# Altium footprint library DipComponent.PcbLib: 303 footprints (part 1 of 19)
Each footprint in its own frame and in the unit in brackets; x right, y up, seen from the top. Pads: shape width x height; smd on the part's side, far side on the other; paste and mask are expansions set on the pad; w line width, h text height; cw(c..) or ccw(c..) is an arc to the next point about the centre after c.
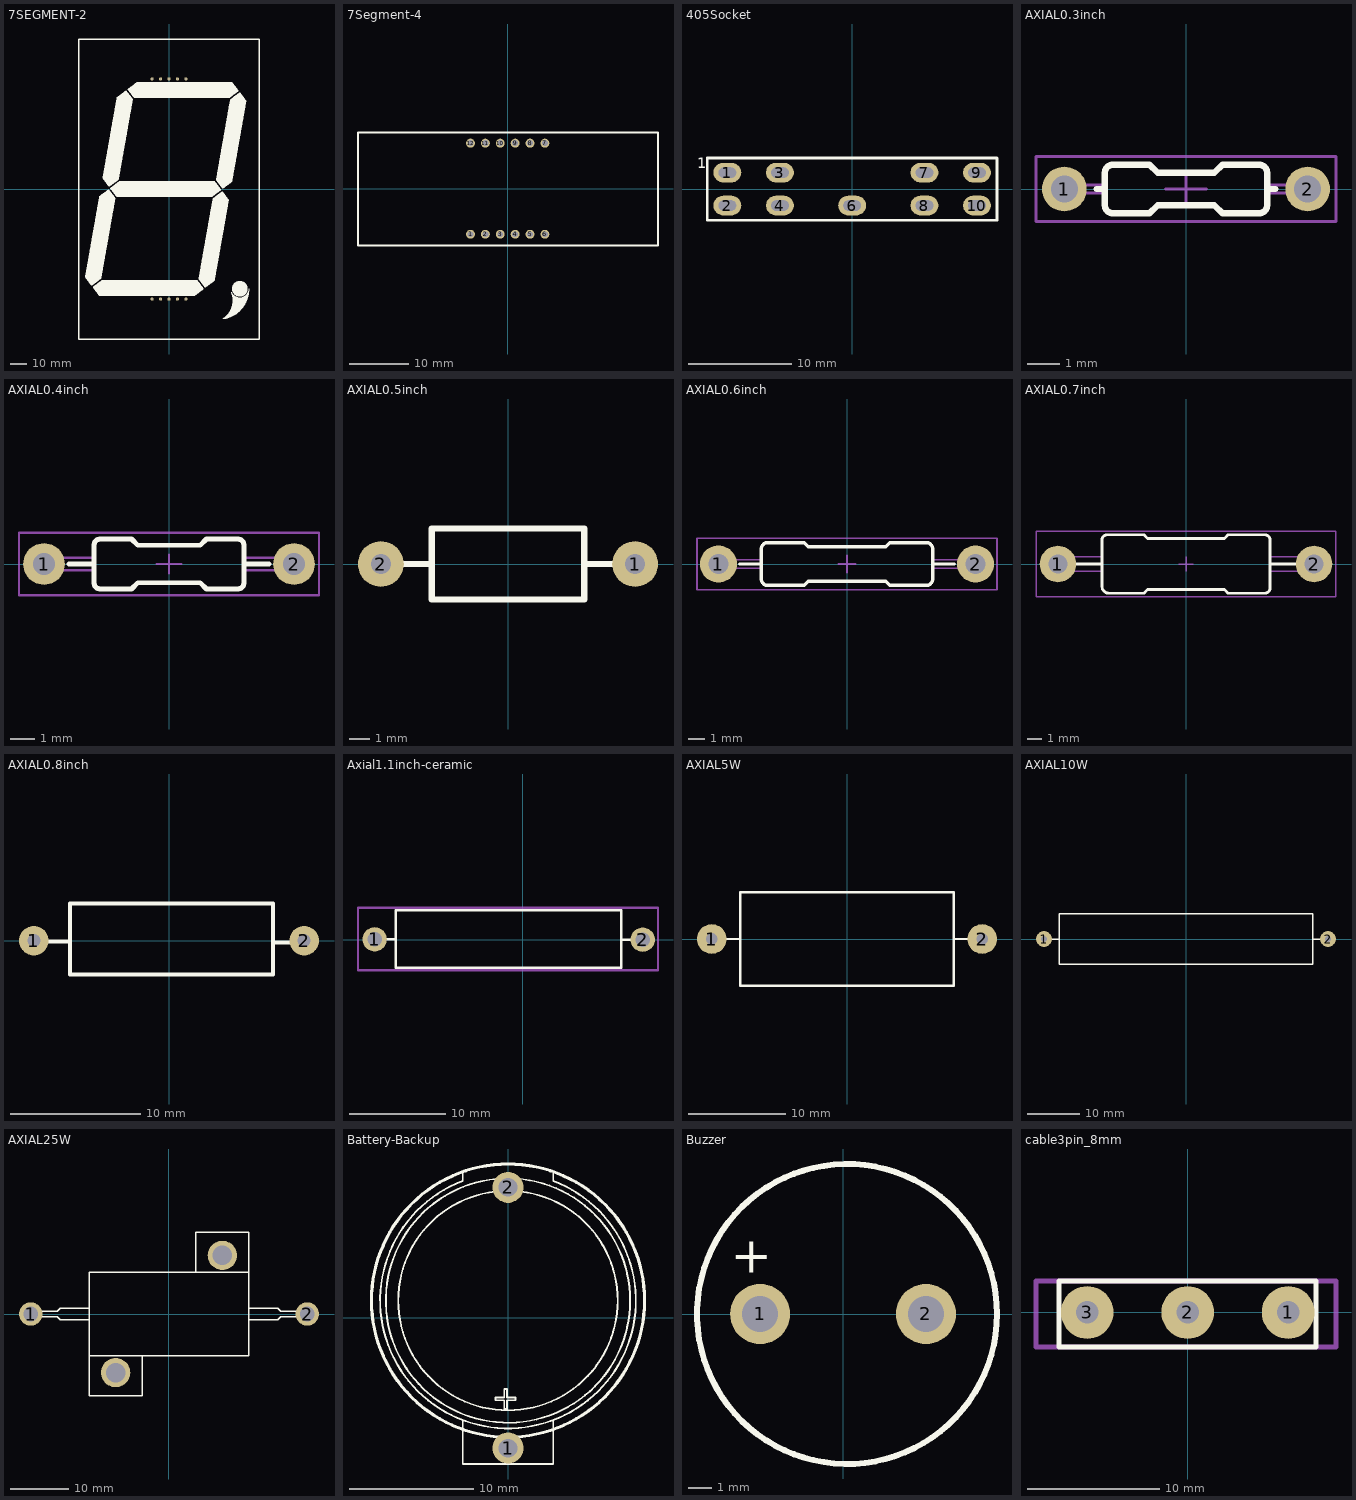
[diagram p0: the footprints below, top view; thin cyan lines are the x and y axes]

## 7SEGMENT-2 [mm]
pads (10):
  round 2 hole 0.85: 1(-10.16,-66.002) 2(-5.08,-66.002) 3(0,-66.002) 4(5.08,-66.002) 5(10.16,-66.002) 6(10.16,66.002) 7(5.08,66.002) 8(0,66.002) 9(-5.08,66.002) 10(-10.16,66.002)
Top Overlay:
  drawing of 13 lines, arcs and shapes, not listed
3D body "7Segment.STEP": height 15.6, standoff -4.3, extent -54.01,-90.002 53.99,89.998

## 7Segment-4 [mm]
pads (12):
  round 1.5 hole 1: 1(-6.25,-7.65) 2(-3.75,-7.65) 3(-1.25,-7.65) 4(1.25,-7.65) 5(3.75,-7.65) 6(6.25,-7.65) 7(6.25,7.65) 8(3.75,7.65) 9(1.25,7.65) 10(-1.25,7.65) 11(-3.75,7.65) 12(-6.25,7.65)
Top Overlay:
  lines w0.349: -25.15,-9.55 -25.15,9.45 25.25,9.45 25.25,-9.55 -25.15,-9.55
3D body "User Library-C-564 (7 segment 4 digit LED display).STEP": height 8, standoff -6.2, extent -25.15,-9.55 25.25,9.45

## 405Socket [mm]
pads (9):
  oval 2.7x1.9 hole 1 slot 1.7 at 0 deg: 1(-12.065,1.587) 2(-12.065,-1.587) 3(-6.985,1.587) 4(-6.985,-1.587) 6(0,-1.587) 7(6.985,1.587) 8(6.985,-1.587) 9(12.065,1.587) 10(12.065,-1.587)
Top Overlay:
  lines w0.254: -14,-3 -14,3 14,3 14,-3 -14,-3
  text "1" at -15,2 h1.02

## AXIAL0.3inch [mm] "Resistor, Axial; Body 5.08 x 1.6 mm ,Pitch 7.62mm"
height 1.524
pads (2):
  round 1.4 hole 0.85: 1(-3.81,0) 2(3.81,0)
Top Overlay:
  lines w0.2: -2.794,0 -2.54,0 ; 2.543,0 2.794,0 ; -2.54,-0.508 ccw(c-2.286,-0.508) -2.286,-0.762 -1.143,-0.762 -0.889,-0.508 0.889,-0.508 1.143,-0.762 2.286,-0.762 ccw(c2.286,-0.508) 2.54,-0.508 2.54,0.508 ccw(c2.286,0.508) 2.286,0.762 1.143,0.762 0.889,0.508 -0.889,0.508 -1.143,0.762 -2.286,0.762 ccw(c-2.286,0.508) -2.54,0.508 -2.54,-0.508
Mechanical 13:
  lines w0.1: -3.683,-0.127 -3.683,0.127 ; -2.54,-0.127 -3.937,-0.127 cw(c-3.937,0) -4.064,0 cw(c-3.937,0) -3.937,0.127 -2.54,0.127 ; 2.54,-0.127 3.937,-0.127 ccw(c3.937,0) 4.064,0 ccw(c3.937,0) 3.937,0.127 2.54,0.127 ; 3.683,-0.127 3.683,0.127 ; -2.54,-0.508 ccw(c-2.286,-0.508) -2.286,-0.762 -1.143,-0.762 -0.889,-0.508 0.889,-0.508 1.143,-0.762 2.286,-0.762 ccw(c2.286,-0.508) 2.54,-0.508 2.54,0.508 ccw(c2.286,0.508) 2.286,0.762 1.143,0.762 0.889,0.508 -0.889,0.508 -1.143,0.762 -2.286,0.762 ccw(c-2.286,0.508) -2.54,0.508 -2.54,-0.508
Mechanical 15:
  lines w0.1: -0.635,0 0,0 ; 0,-0.508 0,0 ; 0,0.508 0,0 ; 0.635,0 0,0 ; -4.699,-1.016 4.699,-1.016 4.699,1.016 -4.699,1.016 -4.699,-1.016
3D body: height 1.52, standoff 0, extent -2.541,-0.763 2.541,0.763
3D body: height 0.9, standoff 0.7, extent -3.683,-0.127 -2.54,0.127
3D body: height 0.9, standoff 0, extent -4.064,-0.127 -3.683,0.127
3D body: height 0.9, standoff 0, extent 3.683,-0.127 4.064,0.127
3D body: height 0.9, standoff 0.7, extent 2.54,-0.127 3.683,0.127

## AXIAL0.4inch [mm] "Resistor, Axial; Body 6.1 x 2mm ,Pitch 10.16mm"
height 2.032
pads (2):
  round 1.7 hole 0.9: 1(-5.08,0) 2(5.08,0)
Top Overlay:
  lines w0.2: -4.064,0 -3.048,0 ; 3.048,0 4.064,0 ; -3.048,-0.762 ccw(c-2.794,-0.762) -2.794,-1.016 -1.524,-1.016 -1.27,-0.762 1.27,-0.762 1.524,-1.016 2.794,-1.016 ccw(c2.794,-0.762) 3.048,-0.762 3.048,0.762 ccw(c2.794,0.762) 2.794,1.016 1.524,1.016 1.27,0.762 -1.27,0.762 -1.524,1.016 -2.794,1.016 ccw(c-2.794,0.762) -3.048,0.762 -3.048,-0.762
Mechanical 13:
  lines w0.1: -4.953,-0.254 -4.953,0.254 ; -3.048,-0.254 -5.207,-0.254 cw(c-5.207,-0.127) -5.334,-0.127 -5.334,0.127 cw(c-5.207,0.127) -5.207,0.254 -3.048,0.254 ; 3.048,-0.254 5.207,-0.254 ccw(c5.207,-0.127) 5.334,-0.127 5.334,0.127 ccw(c5.207,0.127) 5.207,0.254 3.048,0.254 ; 4.953,-0.254 4.953,0.254 ; -3.048,-0.762 ccw(c-2.794,-0.762) -2.794,-1.016 -1.524,-1.016 -1.27,-0.762 1.27,-0.762 1.524,-1.016 2.794,-1.016 ccw(c2.794,-0.762) 3.048,-0.762 3.048,0.762 ccw(c2.794,0.762) 2.794,1.016 1.524,1.016 1.27,0.762 -1.27,0.762 -1.524,1.016 -2.794,1.016 ccw(c-2.794,0.762) -3.048,0.762 -3.048,-0.762
Mechanical 15:
  lines w0.1: -0.508,0 0,0 ; 0,-0.381 0,0 ; 0,0.381 0,0 ; 0.508,0 0,0 ; -6.096,-1.27 6.096,-1.27 6.096,1.27 -6.096,1.27 -6.096,-1.27
3D body "SW3dPS-AXIAL_RESISTOR(0.25W).STEP": height 2.58, standoff -1.52, extent -5.425,-1.282 5.375,1.118

## AXIAL0.5inch [mil]
height 62.99
pads (2):
  round 90 hole 39.37: 1(250,0) 2(-250,0)
Top Overlay:
  lines w12: -210,0 -150,0 ; 150,0 210,0 ; -150,-70 -150,70 150,70 150,-70 -150,-70

## AXIAL0.6inch [mm] "Resistor, Axial; Body 10.16 x 2.54mm ,Pitch 15.24mm"
height 2.54
pads (2):
  round 2.2 hole 1.2: 1(-7.62,0) 2(7.62,0)
Top Overlay:
  lines w0.2: -6.35,0 -5.08,0 ; 4.572,-1.27 4.699,-1.27 ; 5.08,0 6.35,0 ; 4.699,-1.27 ccw(c4.699,-0.889) 5.08,-0.889 5.08,0.889 ccw(c4.699,0.889) 4.699,1.27 2.54,1.27 2.286,1.016 -2.286,1.016 -2.54,1.27 -4.699,1.27 ccw(c-4.699,0.889) -5.08,0.889 -5.08,-0.889 ccw(c-4.699,-0.889) -4.699,-1.27 -2.54,-1.27 -2.286,-1.016 2.286,-1.016 2.54,-1.27 4.699,-1.27
Mechanical 13:
  lines w0.1: -7.366,-0.254 -7.366,0.254 ; -5.08,-0.254 -7.62,-0.254 cw(c-7.62,-0.127) -7.747,-0.127 -7.747,0.127 cw(c-7.62,0.127) -7.62,0.254 -5.08,0.254 ; 4.572,-1.27 4.699,-1.27 ; 5.08,-0.254 7.62,-0.254 ccw(c7.62,-0.127) 7.747,-0.127 7.747,0.127 ccw(c7.62,0.127) 7.62,0.254 5.08,0.254 ; 7.366,-0.254 7.366,0.254 ; 4.699,-1.27 ccw(c4.699,-0.889) 5.08,-0.889 5.08,0.889 ccw(c4.699,0.889) 4.699,1.27 2.54,1.27 2.286,1.016 -2.286,1.016 -2.54,1.27 -4.699,1.27 ccw(c-4.699,0.889) -5.08,0.889 -5.08,-0.889 ccw(c-4.699,-0.889) -4.699,-1.27 -2.54,-1.27 -2.286,-1.016 2.286,-1.016 2.54,-1.27 4.699,-1.27
Mechanical 15:
  lines w0.1: -0.508,0 0,0 ; 0,-0.508 0,0 ; 0,0.508 0,0 ; 0.508,0 0,0 ; -8.89,-1.524 -8.89,1.524 8.89,1.524 8.89,-1.524 -8.89,-1.524
3D body "SW3dPS-5083NW20K00J12AFX-2.STEP": height 3.66, standoff -2.53, extent -8.103,-1.753 7.937,1.747

## AXIAL0.7inch [mm] "Resistor, Axial; Body 11.7x 4.1mm ,Pitch 17.78mm"
height 4.064
pads (2):
  round 2.54 hole 1.3: 1(-8.89,0) 2(8.89,0)
Top Overlay:
  lines w0.2: -7.62,0 -5.842,0 ; 5.842,0 7.62,0 ; 5.842,1.524 5.842,1.651 ; 5.842,1.651 ccw(c5.461,1.651) 5.461,2.032 2.921,2.032 2.667,1.778 -2.667,1.778 -2.921,2.032 -5.334,2.032 -5.461,2.032 ccw(c-5.461,1.651) -5.842,1.651 -5.842,-1.524 ccw(c-5.334,-1.524) -5.334,-2.032 -2.921,-2.032 -2.667,-1.778 2.667,-1.778 2.921,-2.032 5.461,-2.032 ccw(c5.461,-1.651) 5.842,-1.651 5.842,1.651
Mechanical 13:
  lines w0.1: -8.636,-0.508 -8.636,0.508 ; -5.842,-0.508 -9.017,-0.508 cw(c-9.017,-0.381) -9.144,-0.381 -9.144,0.381 cw(c-9.017,0.381) -9.017,0.508 -5.842,0.508 ; 5.842,-0.508 9.017,-0.508 ccw(c9.017,-0.381) 9.144,-0.381 9.144,0.381 ccw(c9.017,0.381) 9.017,0.508 5.842,0.508 ; 5.842,1.524 5.842,1.651 ; 8.636,-0.508 8.636,0.508 ; 5.842,1.651 ccw(c5.461,1.651) 5.461,2.032 2.921,2.032 2.667,1.778 -2.667,1.778 -2.921,2.032 -5.334,2.032 -5.461,2.032 ccw(c-5.461,1.651) -5.842,1.651 -5.842,-1.524 ccw(c-5.334,-1.524) -5.334,-2.032 -2.921,-2.032 -2.667,-1.778 2.667,-1.778 2.921,-2.032 5.461,-2.032 ccw(c5.461,-1.651) 5.842,-1.651 5.842,1.651
Mechanical 15:
  lines w0.1: -0.508,0 0,0 ; 0,-0.508 0,0 ; 0,0.508 0,0 ; 0.508,0 0,0 ; -10.414,-2.286 -10.414,2.286 10.414,2.286 10.414,-2.286 -10.414,-2.286
3D body "Res70 2W SilCoat.step": height 5.77, standoff -1.5, extent -9.295,-2.766 9.295,2.715

## AXIAL0.8inch [mil]
pads (2):
  round 90 hole 39.37: 1(-410,0) 2(410,0)
Top Overlay:
  lines w12: -371,-3 -301,-3 ; 318,-5 388,-5 ; -300,-102 -300,112 315,112 315,-102 -300,-102
3D body "RES-2W.STEP": height 0, standoff -334.65, extent -412.78,-100 414.78,116.54

## Axial1.1inch-ceramic [mm] "res 5W"
pads (2):
  round 2.54 hole 1.5: 1(-15.412,0.025) 2(12.5,0)
Top Overlay:
  lines w0.254: -15.412,0.025 -13.208,0.025 ; 10.287,0 12.5,0 ; -13.208,-2.921 -13.208,3.048 10.287,3.048 10.287,-2.921 -13.208,-2.921
Mechanical 15:
  lines w0.254: -17.145,-3.175 14.097,-3.175 14.097,3.302 -17.145,3.302 -17.145,-3.175
3D body "RES-5W-High.STEP": height 10.01, standoff -7, extent -15.811,-2.975 12.929,3.025

## AXIAL5W [mil]
pads (2):
  round 120 hole 47.24: 1(-550,0) 2(550,0)
Top Overlay:
  lines w10: -490,0 -435,0 ; 435,0 490,0 ; -435,-190 -435,190 435,190 435,-190 -435,-190

## AXIAL10W [mil]
pads (2):
  round 120 hole 47.24: 1(-1065,0) 2(1065,0)
Top Overlay:
  lines w10: -1005,0 -950,0 ; 950,0 1005,0 ; -950,-190 -950,190 950,190 950,-190 -950,-190

## AXIAL25W [mm]
pads (4):
  round 4 hole 2.5: 1(-23.6,0) 2(23.6,0)
  round 5 hole 3.3: ""(-9.1,-10) ""(9.1,10)
Top Overlay:
  circle w0.254: c9.1,10 r1.65
  circle w0.254: c-9.1,-10 r1.65
  lines w0.254: -13.6,-1 -18.6,-1 -19.1,-0.5 -23.6,-0.5 -23.6,0 -23.6,0.5 -19.1,0.5 -18.6,1 -13.6,1 ; 13.6,-1 18.6,-1 19.1,-0.5 23.6,-0.5 23.6,0 23.6,0.5 19.1,0.5 18.6,1 13.6,1 ; -13.6,-7.15 -4.6,-7.15 -4.6,-13.95 -13.6,-13.95 -13.6,-7.15 ; -13.6,-7.15 -13.6,7.15 13.6,7.15 ; -13.6,-7.15 13.6,-7.15 13.6,7.15 ; 13.6,7.15 4.6,7.15 4.6,13.95 13.6,13.95 13.6,7.15

## Battery-Backup [mm]
height 5
pads (2):
  round 2.5 hole 1.5: 1(0,-10.503) 2(0,10.503)
Top Overlay:
  circle w0.254: c0,1.384 r11
  circle w0.15: c-0.002,1.386 r8.844
  circle w0.15: c-0.002,1.386 r9.844
  lines w0.15: -3.652,-8.991 cw(c-0.002,1.386) 3.648,-8.991 ; -3.652,-8.247 -3.652,-11.784 3.648,-11.784 3.648,-8.247 ; -3.652,11.762 -3.652,11.019 ccw(c-0.002,1.386) 3.648,11.019 3.648,11.762 ; -1.008,-6.646 -0.306,-6.646 -0.306,-7.349 -0.092,-7.349 -0.092,-6.646 0.61,-6.646 0.61,-6.433 -0.092,-6.433 -0.092,-5.731 -0.306,-5.731 -0.306,-6.433 -1.008,-6.433 -1.008,-6.646
3D body "Backup Battery.STEP": height 8.49, standoff 0.02, extent -11.02,-11.807 10.963,12.363

## Buzzer [mil]
height 393.7
pads (2):
  round 100 hole 60: 1(-137.79,0) 2(137.8,0)
Top Overlay:
  circle w10: c6.56,0 r249.36
  text "+" at -117.8,120 h60
3D body "SW3dPS-WST-1203UX.STEP": height 380.4, standoff -176.68, extent -367.37,-234.99 240.72,237.45

## cable3pin_8mm [mm]
pads (3):
  round 4 hole 1.7: 1(7.62,0) 2(0,0) 3(-7.62,0)
Top Overlay:
  lines w0.381: -9.75,-2.62 -9.75,2.38 9.75,2.38 9.75,-2.62 -9.75,-2.62
Mechanical 15:
  lines w0.381: -11.5,-2.62 -11.5,2.38 11.25,2.38 11.25,-2.62 -11.5,-2.62